# Altium footprint library OpenRec.PcbLib: 90 footprints (part 3 of 6)
Each footprint in its own frame and in the unit in brackets; x right, y up, seen from the top. Pads: shape width x height; smd on the part's side, far side on the other; paste and mask are expansions set on the pad; w line width, h text height; cw(c..) or ccw(c..) is an arc to the next point about the centre after c.
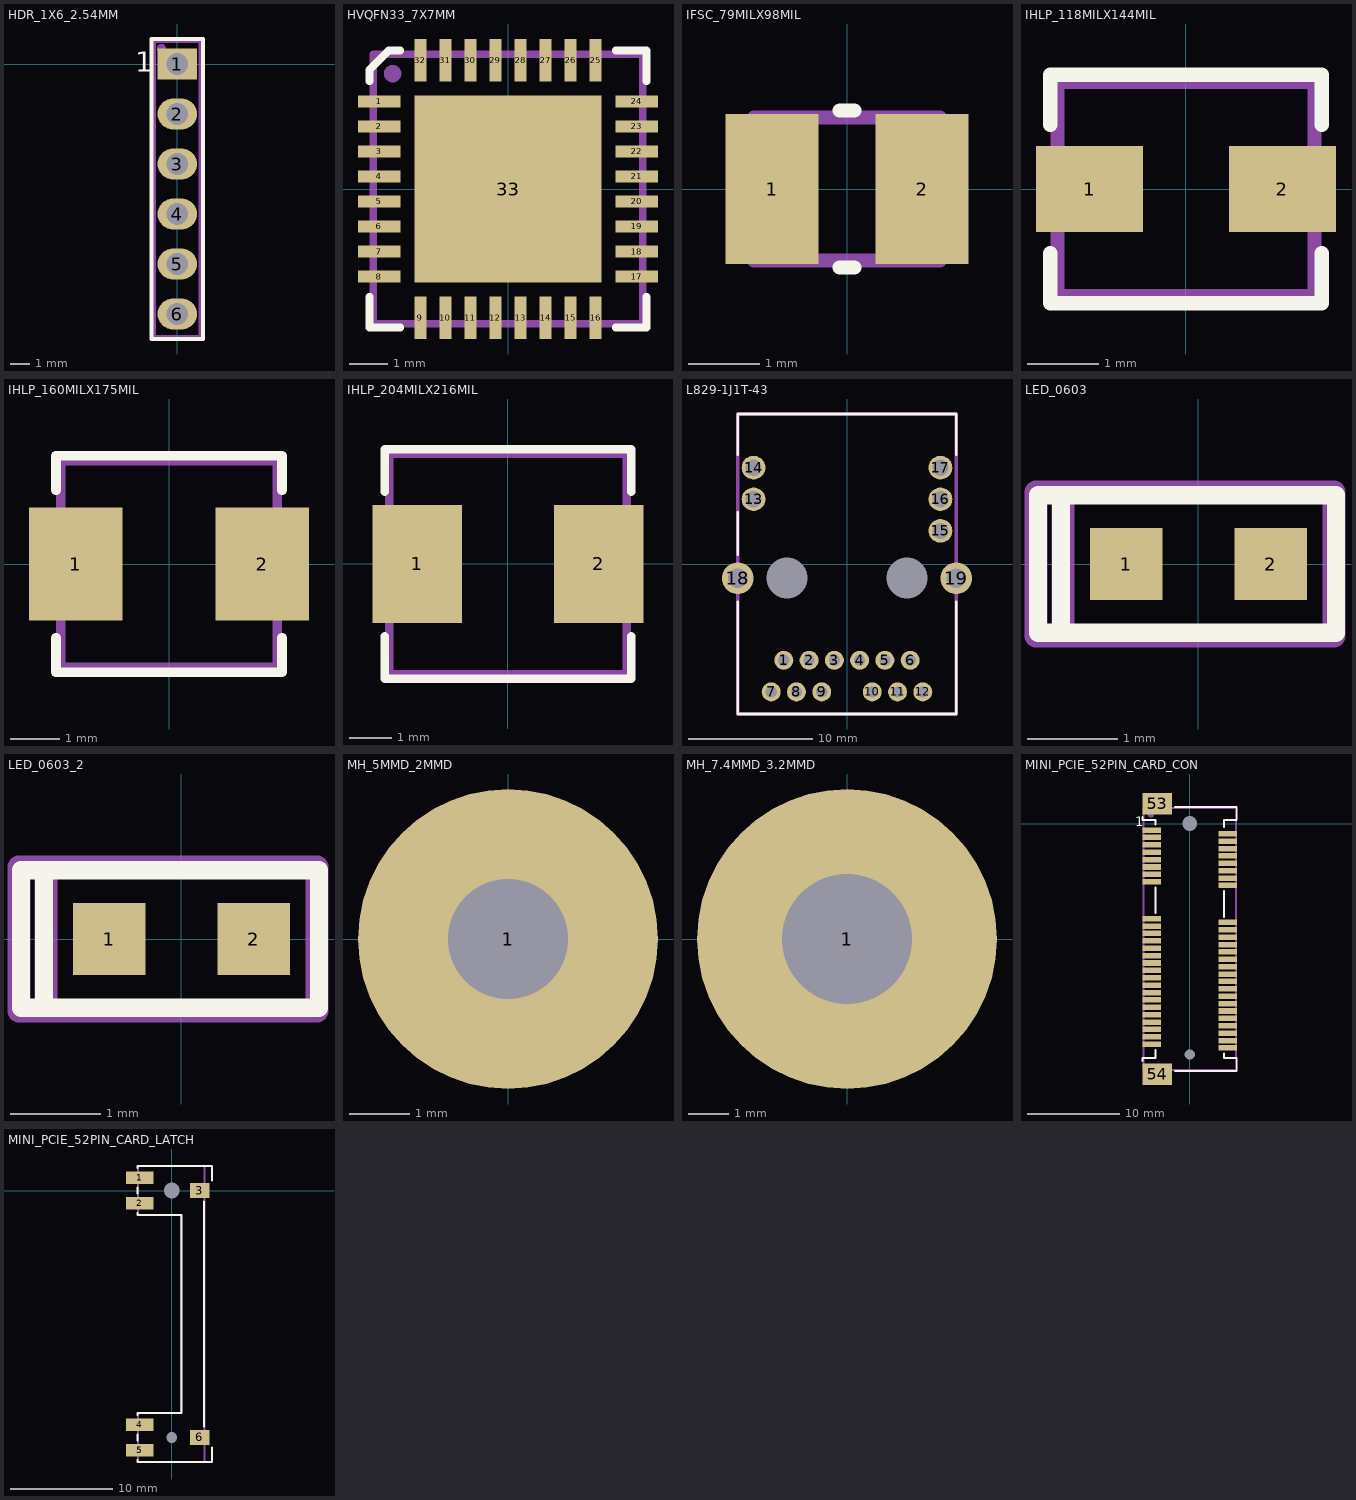
[diagram p2: the footprints below, top view; thin cyan lines are the x and y axes]

## HDR_1X6_2.54MM [mm]
pads (6):
  rect 2x1.6 hole 1.1: 1(0,0)
  oval 2x1.6 hole 1.1: 2(0,-2.54) 3(0,-5.08) 4(0,-7.62) 5(0,-10.16) 6(0,-12.7)
Top Overlay:
  lines w0.2: -1.3,-13.97 1.3,-13.97 1.3,1.27 -1.3,1.27 -1.3,-13.97
  text "1" at -2.14,-0.4 h1.02
Assembly Drawing:
  circle w0.254: c-0.8,0.79 r0.1
  lines w0.254: -1.2,-13.89 1.2,-13.89 1.2,1.19 -1.2,1.19 -1.2,-13.89
  text ".Designator" at 0.76,-7.9 h1.52
3D body "77311-y18-06_asm.stp": height 8.4, standoff -3.1, extent -1.205,-13.77 1.205,1.07

## HVQFN33_7X7MM [mm]
pads (33):
  rect 1.1x0.3 smd mask+0.06: 1(-3.35,2.275) 2(-3.35,1.625) 3(-3.35,0.975) 4(-3.35,0.325) 5(-3.35,-0.325) 6(-3.35,-0.975) 7(-3.35,-1.625) 8(-3.35,-2.275) 17(3.35,-2.275) 18(3.35,-1.625) 19(3.35,-0.975) 20(3.35,-0.325) 21(3.35,0.325) 22(3.35,0.975) 23(3.35,1.625) 24(3.35,2.275)
  rect 0.3x1.1 smd mask+0.06: 9(-2.275,-3.35) 10(-1.625,-3.35) 11(-0.975,-3.35) 12(-0.325,-3.35) 13(0.325,-3.35) 14(0.975,-3.35) 15(1.625,-3.35) 16(2.275,-3.35) 25(2.275,3.35) 26(1.625,3.35) 27(0.975,3.35) 28(0.325,3.35) 29(-0.325,3.35) 30(-0.975,3.35) 31(-1.625,3.35) 32(-2.275,3.35)
  rect 4.85x4.85 smd paste-10 mask+0.06: 33(0,0)
Top Overlay:
  lines w0.2: -3.6,-2.8 -3.6,-3.6 -2.8,-3.6 ; -3.6,2.8 -3.6,3.1 -3.1,3.6 -2.8,3.6 ; 2.8,-3.6 3.6,-3.6 3.6,-2.8 ; 2.8,3.6 3.6,3.6 3.6,2.8
Top Paste:
  region: 0.2,2.2 0.2,0.2 2.2,0.2 2.2,2.2
  region: 2.2,-0.2 0.2,-0.2 0.2,-2.2 2.2,-2.2
  region: -0.2,-2.2 -0.2,-0.2 -2.2,-0.2 -2.2,-2.2
  rectangle: -2.2,0.2 -0.2,2.2
Assembly Drawing:
  circle w0.254: c-3,3 r0.1
  lines w0.2: -3.5,-3.5 -3.5,3.5 3.5,3.5 3.5,-3.5 -3.5,-3.5
  text ".Designator" at -0.6,-0.8 h1
3D body: height 1, standoff 0, extent -3.5,-3.5 3.5,3.5

## IFSC_79MILX98MIL [mm]
pads (2):
  rect 1.3x2.1 smd: 1(-1.05,0) 2(1.05,0)
Top Overlay:
  lines w0.2: -0.1,-1.1 0.1,-1.1 ; -0.1,1.1 0.1,1.1
Assembly Drawing:
  lines w0.2: -1.3,-1 1.3,-1 1.3,1 -1.3,1 -1.3,-1
  text ".Designator" at 0.2,-0.5 h0.6
3D body: height 1.2, standoff 0, extent -1.3,-1 1.3,1

## IHLP_118MILX144MIL [mm]
pads (2):
  rect 1.5x1.2 smd: 1(-1.35,0) 2(1.35,0)
Top Overlay:
  lines w0.2: -1.9,-0.9 -1.9,-1.6 1.9,-1.6 1.9,-0.9 ; -1.9,0.9 -1.9,1.6 1.9,1.6 1.9,0.9
Assembly Drawing:
  lines w0.2: -1.8,-1.5 -1.8,1.5 1.8,1.5 1.8,-1.5 -1.8,-1.5
  text ".Designator" at -0.5,0.6 h1
3D body: height 1.5, standoff 0, extent -1.9,-1.5 1.9,1.5

## IHLP_160MILX175MIL [mm]
pads (2):
  rect 1.9x2.3 smd: 1(-1.9,0) 2(1.9,0)
Top Overlay:
  lines w0.2: -2.3,-1.5 -2.3,-2.2 2.3,-2.2 2.3,-1.5 ; -2.3,1.5 -2.3,2.2 2.3,2.2 2.3,1.5
Assembly Drawing:
  lines w0.2: -2.2,-2.1 2.2,-2.1 2.2,2.1 -2.2,2.1 -2.2,-2.1
  text ".Designator" at -0.5,1 h1
3D body: height 1.2, standoff 0, extent -2.3,-2.1 2.3,2.1

## IHLP_204MILX216MIL [mm]
pads (2):
  rect 2.115x2.79 smd: 1(-2.137,0) 2(2.138,0)
Top Overlay:
  lines w0.2: -2.9,-1.7 -2.9,-2.7 2.9,-2.7 2.9,-1.7 ; -2.9,1.7 -2.9,2.7 2.9,2.7 2.9,1.7
Assembly Drawing:
  lines w0.2: -2.8,-2.6 -2.8,2.6 2.8,2.6 2.8,-2.6 -2.8,-2.6
  text ".Designator" at 1.9,0.8 h1.52
3D body: height 3, standoff 0, extent -2.75,-2.6 2.75,2.6

## L829-1J1T-43 [mil]
pads (21):
  round 60 hole 35.43: 1(-200,-305) 2(-120,-305) 3(-40,-305) 4(40,-305) 5(120,-305) 6(200,-305) 7(-240,-405) 8(-160,-405) 9(-80,-405) 10(80,-405) 11(160,-405) 12(240,-405)
  round 75 hole 51.18: 13(-296,205) 14(-296,305) 15(296,105) 16(296,205) 17(296,305)
  round 100 hole 63: 18(-346,-45) 19(346,-45)
  round 0 hole 129.92: ""(-190,-45) ""(190,-45)
Top Overlay:
  lines w8: -346,-120 -346,-475 346,-475 346,-120 ; -346,30 -346,164 ; -346,346 -346,475 346,475 346,346
Assembly Drawing:
  lines w10: -346,-475 -346,475 346,475 346,-475 -346,-475
  text ".Designator" at -55.12,-177.17 h60
3D body "l829-1j1t-43.stp": height 493.65, standoff -150.89, extent -400.54,-471.86 400.54,494.49

## LED_0603 [mm]
pads (2):
  rect 0.8x0.8 smd: 1(-0.8,0) 2(0.8,0)
Top Overlay:
  lines w0.2: -1.524,-0.762 -1.524,0.762 ; -1.778,-0.762 1.524,-0.762 1.524,0.762 -1.778,0.762 -1.778,-0.762
Assembly Drawing:
  lines w0.254: -1.5,-0.8 -1.5,0.8 ; -1.8,-0.8 -1.8,0.8 1.5,0.8 1.5,-0.8 -1.8,-0.8
  text ".Designator" at 0.5,0.3 h0.6
3D body "LED SMD 0603.step": height 0.65, standoff 0, extent -0.85,-0.4 0.85,0.4
3D body: height 0.66, standoff 0.5, extent -0.2,-0.2 0.2,0.2

## LED_0603_2 [mm]
pads (2):
  rect 0.8x0.8 smd: 1(-0.8,0) 2(0.8,0)
Top Overlay:
  lines w0.2: -1.524,-0.762 -1.524,0.762 ; -1.778,-0.762 1.524,-0.762 1.524,0.762 -1.778,0.762 -1.778,-0.762
Assembly Drawing:
  lines w0.254: -1.5,-0.8 -1.5,0.8 ; -1.8,-0.8 -1.8,0.8 1.5,0.8 1.5,-0.8 -1.8,-0.8
  text ".Designator" at 0.8,0.3 h0.6
3D body "LED SMD 0603.step": height 0.65, standoff 0, extent -0.85,-0.4 0.85,0.4
3D body: height 0.66, standoff 0.5, extent -0.2,-0.2 0.2,0.2

## MH_5MMD_2MMD [mm]
pads (1):
  round 5 / inner round 3.683 / far side round 5 hole 2: 1(0,0)

## MH_7.4MMD_3.2MMD [mm]
pads (1):
  round 7.4 / inner round 3.683 / far side round 7.4 hole 3.2 mask+0.025: 1(0,0)

## MICRO_SD_CARD [mm]
3D body "Micro_SD_Card.step": height 1.95, standoff 0.97, extent -8.65,-13.74 2.35,1.26

## MICRO_SIM_CARD [mm]
3D body "microsim.STEP": height 1.7, standoff 0.94, extent 0,-15 12,0

## MINI_PCIE_52PIN_CARD_CON [mm]
pads (56):
  rect 2x0.6 smd mask+0.05: 1(-4.1,-0.7) 2(4.1,-1.1) 3(-4.1,-1.5) 4(4.1,-1.9) 5(-4.1,-2.3) 6(4.1,-2.7) 7(-4.1,-3.1) 8(4.1,-3.5) 9(-4.1,-3.9) 10(4.1,-4.3) 11(-4.1,-4.7) 12(4.1,-5.1) 13(-4.1,-5.5) 14(4.1,-5.9) 15(-4.1,-6.3) 16(4.1,-6.7) 17(-4.1,-10.3) 18(4.1,-10.7) 19(-4.1,-11.1) 20(4.1,-11.5) 21(-4.1,-11.9) 22(4.1,-12.3) 23(-4.1,-12.7) 24(4.1,-13.1) 25(-4.1,-13.5) 26(4.1,-13.9) 27(-4.1,-14.3) 28(4.1,-14.7) 29(-4.1,-15.1) 30(4.1,-15.5) 31(-4.1,-15.9) 32(4.1,-16.3) 33(-4.1,-16.7) 34(4.1,-17.1) 35(-4.1,-17.5) 36(4.1,-17.9) 37(-4.1,-18.3) 38(4.1,-18.7) 39(-4.1,-19.1) 40(4.1,-19.5) 41(-4.1,-19.9) 42(4.1,-20.3) 43(-4.1,-20.7) 44(4.1,-21.1) 45(-4.1,-21.5) 46(4.1,-21.9) 47(-4.1,-22.3) 48(4.1,-22.7) 49(-4.1,-23.1) 50(4.1,-23.5) 51(-4.1,-23.9) 52(4.1,-24.3)
  rect 3.2x2.3 smd: 53(-3.5,2.15) 54(-3.5,-27.15)
  rrect0% 0x0 hole 1.6 unplated: 55(0,0)
  rrect0% 0x0 hole 1.1 unplated: 56(0,-25)
Top Overlay:
  lines w0.2: -5.1,-25.7 -5.1,-25.4 -3.7,-25.4 -3.7,-24.5 ; -5.1,0.7 -5.1,0.4 -3.7,0.4 -3.7,-0.1 ; -3.7,-9.7 -3.7,-6.9 ; -1.6,-26.8 5.1,-26.8 5.1,-25.4 3.7,-25.4 3.7,-24.9 ; -1.6,1.8 5.1,1.8 5.1,0.4 3.7,0.4 3.7,-0.4 ; 3.7,-10.1 3.7,-7.3
  text "1" at -5.9,-0.3 h1.02
Assembly Drawing:
  circle w0.5: c-4.2,1 r0.1
  lines w0.2: -5,-26.7 -5,1.7 5,1.7 5,-26.7 -5,-26.7
  text ".Designator" at -0.6,-10.6 h1.52
3D body "K3D-MM60-52B1-E1-R2 JAE Connector Division Proprietary.STEP": height 5.95, standoff -0.75, extent -5,-27.35 5,2.35

## MINI_PCIE_52PIN_CARD_LATCH [mm]
pads (8):
  rect 2.7x1.2 smd mask+0.09: 1(-3.15,1.25) 2(-3.15,-1.25) 4(-3.15,-22.95) 5(-3.15,-25.45)
  rect 1.9x1.5 smd mask+0.09: 3(2.75,0) 6(2.75,-24.2)
  rrect0% 0x0 hole 1.55 mask+0.09: 7(0,0)
  rrect0% 0x0 hole 1.05 mask+0.09: 8(0,-24.2)
Top Overlay:
  lines w0.2: -3.35,-26.4 -3.35,-26.6 3.95,-26.6 3.95,-25.2 ; -3.35,-24.5 -3.35,-23.9 ; -3.35,-22 -3.35,-21.8 0.95,-21.8 0.95,-2.4 -3.35,-2.4 -3.35,-2.2 ; -3.35,-0.3 -3.35,0.3 ; -3.35,2.2 -3.35,2.4 3.95,2.4 3.95,1 ; 3.15,-23.1 3.15,-1.1
Assembly Drawing:
  lines w0.2: -3.3,-26.6 3.2,-26.6 3.2,2.4 -3.3,2.4 -3.3,-2.4 0.9,-2.4 0.9,-21.8 -3.3,-21.8 -3.3,-26.6
  text ".Designator" at 1.5,-10.3 h1
3D body "K3D-MM60-EZH059-B5-R2 JAE Connector Division Proprietary.STEP": height 6.7, standoff -0.9, extent -3.95,-26.6 3.95,2.4

## MINI_PCIE_FULL CARD [mm]
3D body "PCI Express Mini Card (Full-Mini Card).step": height 6.9, standoff 2.15, extent 0,0 50.95,30